# Altium footprint library ICL_connectors_v1.PcbLib: 86 footprints (part 1 of 6)
Each footprint in its own frame and in the unit in brackets; x right, y up, seen from the top. Pads: shape width x height; smd on the part's side, far side on the other; paste and mask are expansions set on the pad; w line width, h text height; cw(c..) or ccw(c..) is an arc to the next point about the centre after c.
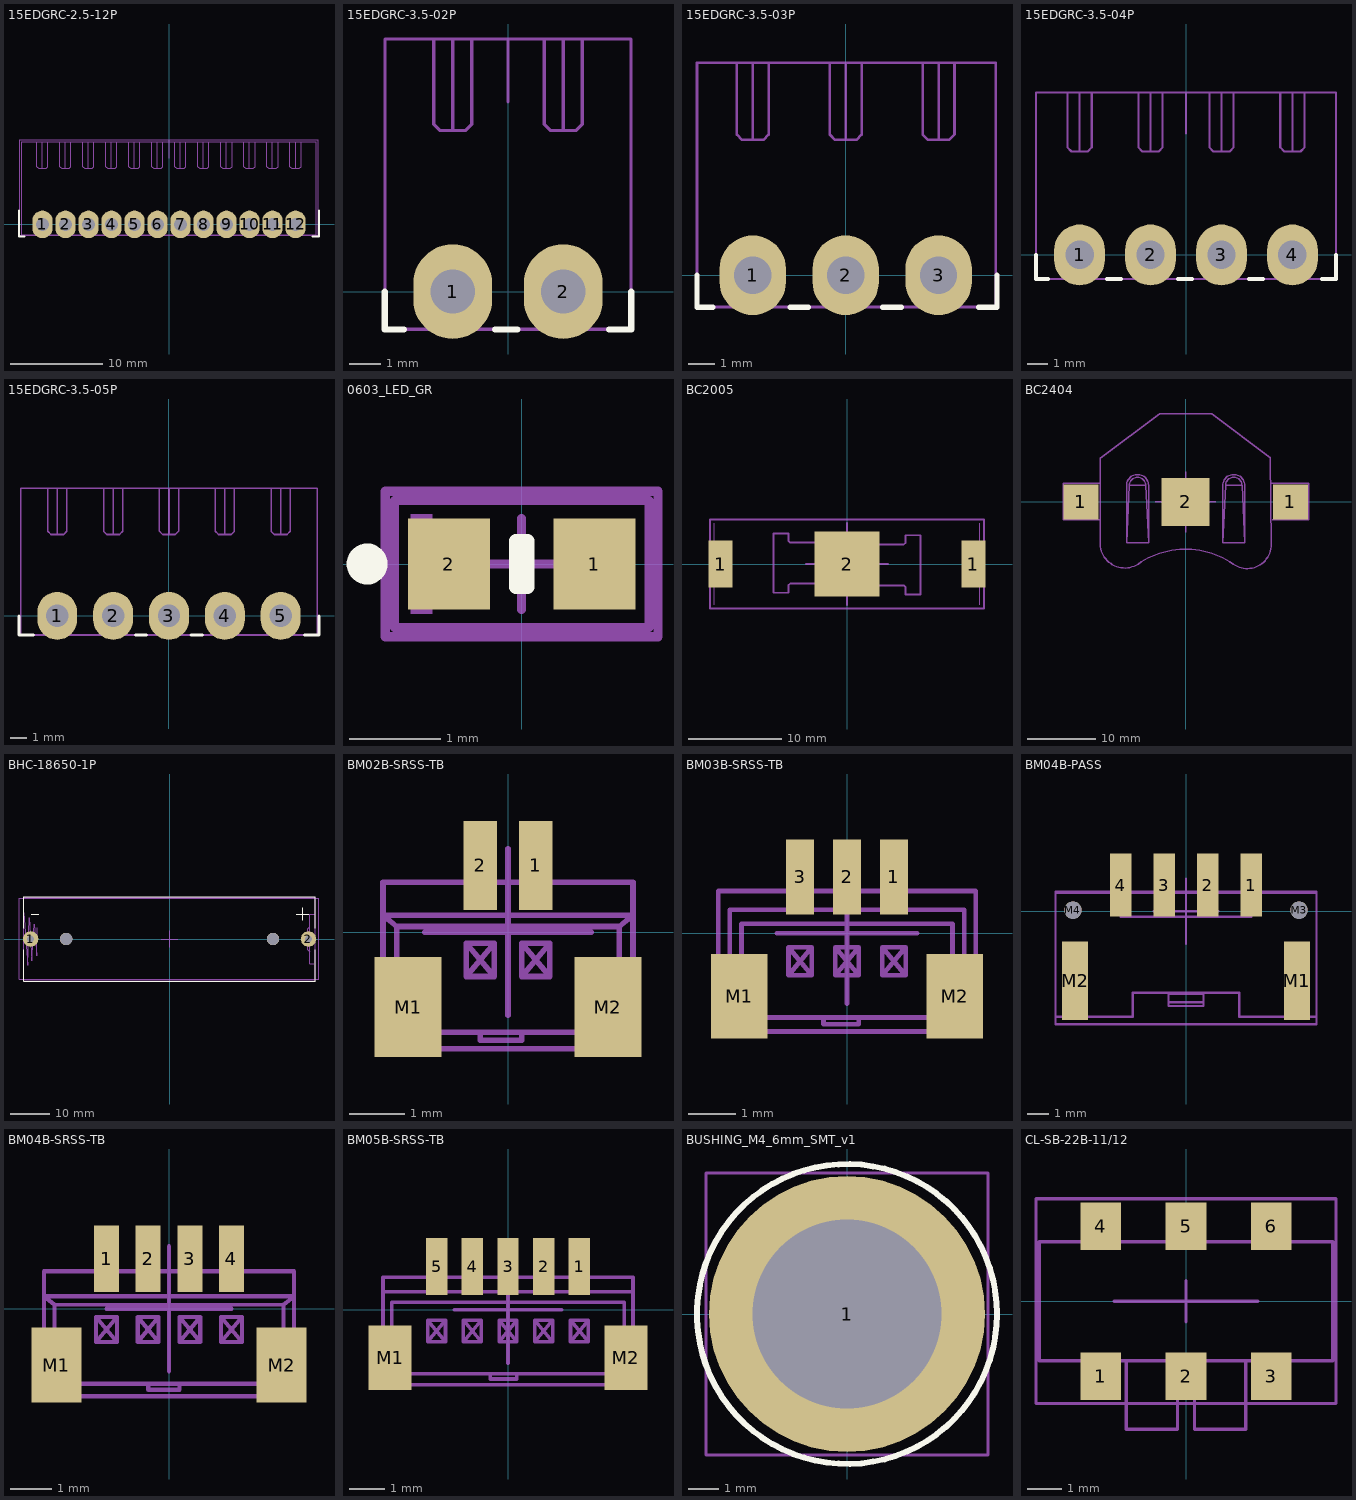
[diagram p0: the footprints below, top view; thin cyan lines are the x and y axes]

## 15EDGRC-2.5-12P [mm] "Dexon"
pads (12):
  oval 2.2x3 hole 1.4 paste-1: 1(-13.75,0) 2(-11.25,0) 3(-8.75,0) 4(-6.25,0) 5(-3.75,0) 6(-1.25,0) 7(1.25,0) 8(3.75,0) 9(6.25,0) 10(8.75,0) 11(11.25,0) 12(13.75,0)
Top Overlay:
  lines w0.2: -16.3,1.5 -16.3,-1.3 -15.7,-1.3 ; 15.6,-1.3 16.3,-1.3 16.3,1.5
Top M17-18_TDES:
  text "'.Designator'" at -6.798,2.1 h1.2
Top M19-20_TMOT:
  lines w0.1: -14.353,8.988 -14.353,6.288 -14.153,6.088 -13.754,6.088 ; -13.754,8.988 -13.754,6.088 ; -13.153,8.988 -13.153,6.288 -13.354,6.088 -13.754,6.088 ; -11.853,8.988 -11.853,6.288 -11.653,6.088 -11.254,6.088 ; -11.254,8.988 -11.254,6.088 ; -10.653,8.988 -10.653,6.288 -10.854,6.088 -11.254,6.088 ; -9.353,8.988 -9.353,6.288 -9.153,6.088 -8.754,6.088 ; -8.754,8.988 -8.754,6.088 ; -8.153,8.988 -8.153,6.288 -8.354,6.088 -8.754,6.088 ; -7.4,-1.191 7.398,-1.191 ; -6.853,8.988 -6.853,6.288 -6.653,6.088 -6.254,6.088 ; -6.254,8.988 -6.254,6.088 ; -5.653,8.988 -5.653,6.288 -5.854,6.088 -6.254,6.088 ; -4.353,8.988 -4.353,6.288 -4.153,6.088 -3.754,6.088 ; -3.754,8.988 -3.754,6.088 ; -3.153,8.988 -3.153,6.288 -3.354,6.088 -3.754,6.088 ; 0.647,8.988 0.647,6.288 0.847,6.088 1.246,6.088 ; 1.246,8.988 1.246,6.088 ; 1.847,8.988 1.847,6.288 1.646,6.088 1.246,6.088 ; 3.147,8.988 3.147,6.288 3.347,6.088 3.746,6.088 ; 3.746,8.988 3.746,6.088 ; 4.347,8.988 4.347,6.288 4.146,6.088 3.746,6.088 ; 5.647,8.988 5.647,6.288 5.847,6.088 6.247,6.088 ; 6.247,8.988 6.247,6.088 ; 6.847,8.988 6.847,6.288 6.646,6.088 6.247,6.088 ; 8.147,8.988 8.147,6.288 8.347,6.088 8.747,6.088 ; 8.747,8.988 8.747,6.088 ; 9.347,8.988 9.347,6.288 9.146,6.088 8.747,6.088 ; 10.647,8.988 10.647,6.288 10.847,6.088 11.247,6.088 ; 11.247,8.988 11.247,6.088 ; 11.847,8.988 11.847,6.288 11.646,6.088 11.247,6.088 ; 13.147,8.988 13.147,6.288 13.347,6.088 13.747,6.088 ; 13.747,8.988 13.747,6.088 ; 14.347,8.988 14.347,6.288 14.146,6.088 13.747,6.088 ; -1.853,6.288 -1.653,6.088 ; -1.853,6.288 -1.853,8.988 -1.853,6.288 ; -1.853,6.288 -1.653,6.088 ; -1.653,6.088 -1.254,6.088 ; -1.653,6.088 -1.254,6.088 ; -1.254,6.088 -0.854,6.088 ; -1.254,6.088 -1.254,8.988 -1.254,6.088 ; -1.254,6.088 -0.854,6.088 ; -0.854,6.088 -0.653,6.288 ; -0.854,6.088 -0.653,6.288 ; -0.653,6.288 -0.653,8.988 -0.653,6.288 ; -16,-1.1 16,-1.1 16,9 -16,9 -16,-1.1
Top M25-26_TORG:
  lines w0.1: 0,7.2 0,9.2 ; -16.2,-1.2 16.2,-1.2 16.2,9.2 -16.2,9.2 -16.2,-1.2
3D body "STP_691382010012 (rev1).stp": height 8.11, standoff -3.49, extent -16,-1.1 16,9

## 15EDGRC-3.5-02P [mm] "Dexon"
pads (2):
  oval 2.5x3 hole 1.4 paste-1: 1(-1.75,0) 2(1.75,0)
Top Overlay:
  lines w0.2: -3.9,0 -3.9,-1.2 -3.3,-1.2 ; -0.4,-1.2 0.3,-1.2 ; 3.2,-1.2 3.9,-1.2 3.9,0
Top M15-16_SORG:
  lines w0.1: 0,6 0,8 ; -3.9,-1.2 -3.9,8 3.9,8 3.9,-1.2 -3.9,-1.2
Top M17-18_TDES:
  text "'.Designator'" at -5.765,2.883 h1
Top M19-20_TMOT:
  lines w0.1: -2.35,8 -2.35,5.3 -2.15,5.1 -1.75,5.1 ; -1.75,8 -1.75,5.1 ; -1.15,8 -1.15,5.3 -1.35,5.1 -1.75,5.1 ; 1.15,8 1.15,5.3 1.35,5.1 1.75,5.1 ; 1.75,8 1.75,5.1 ; 2.35,8 2.35,5.3 2.15,5.1 1.75,5.1 ; -3.9,-1.191 -3.9,8 3.898,8 3.898,-1.191 -3.9,-1.191
3D body "15EDGRC-3_5-2.STEP": height 7.21, standoff -3.39, extent -3.9,-1.2 3.9,8

## 15EDGRC-3.5-03P [mm] "Dexon"
pads (3):
  oval 2.5x3 hole 1.4 paste-1: 1(-3.5,0) 2(0,0) 3(3.5,0)
Top Overlay:
  lines w0.2: -5.6,0 -5.6,-1.2 -5,-1.2 ; -2.1,-1.2 -1.4,-1.2 ; 1.4,-1.2 2.1,-1.2 ; 5,-1.2 5.7,-1.2 5.7,0
Top M15-16_SORG:
  lines w0.1: 0,6 0,8 ; -5.6,-1.2 5.65,-1.2 5.65,8 -5.6,8 -5.6,-1.2
Top M17-18_TDES:
  text "'.Designator'" at -5.665,2.483 h1
Top M19-20_TMOT:
  lines w0.1: -4.1,8 -4.1,5.3 -3.9,5.1 -3.5,5.1 ; -3.5,8 -3.5,5.1 ; -2.9,8 -2.9,5.3 -3.1,5.1 -3.5,5.1 ; -0.6,8 -0.6,5.3 -0.4,5.1 0,5.1 ; 0,8 0,5.1 ; 0.6,8 0.6,5.3 0.4,5.1 0,5.1 ; 2.9,8 2.9,5.3 3.1,5.1 3.5,5.1 ; 3.5,8 3.5,5.1 ; 4.1,8 4.1,5.3 3.9,5.1 3.5,5.1 ; -5.6,-1.191 5.648,-1.191 5.648,8 -5.6,8 -5.6,-1.191
3D body "15EDGRC-3_5-03P.STEP": height 7.21, standoff -3.39, extent -5.6,-1.2 5.65,8

## 15EDGRC-3.5-04P [mm] "Dexon"
pads (4):
  oval 2.5x3 hole 1.4 paste-1: 1(-5.25,0) 2(-1.75,0) 3(1.75,0) 4(5.25,0)
Top Overlay:
  lines w0.2: -7.4,0 -7.4,-1.2 -6.8,-1.2 ; -3.9,-1.2 -3.2,-1.2 ; -0.4,-1.2 0.3,-1.2 ; 3.1,-1.2 3.8,-1.2 ; 6.7,-1.2 7.4,-1.2 7.4,0
Top M17-18_TDES:
  text "'.Designator'" at -6.798,2.1 h1.2
Top M19-20_TMOT:
  lines w0.1: -5.85,8 -5.85,5.3 -5.65,5.1 -5.25,5.1 ; -5.25,8 -5.25,5.1 ; -4.65,8 -4.65,5.3 -4.85,5.1 -5.25,5.1 ; -2.35,8 -2.35,5.3 -2.15,5.1 -1.75,5.1 ; -1.75,8 -1.75,5.1 ; -1.15,8 -1.15,5.3 -1.35,5.1 -1.75,5.1 ; 1.15,8 1.15,5.3 1.35,5.1 1.75,5.1 ; 1.75,8 1.75,5.1 ; 2.35,8 2.35,5.3 2.15,5.1 1.75,5.1 ; 4.65,8 4.65,5.3 4.85,5.1 5.25,5.1 ; 5.25,8 5.25,5.1 ; 5.85,8 5.85,5.3 5.65,5.1 5.25,5.1 ; -7.4,-1.191 7.398,-1.191 7.398,8 -7.4,8 -7.4,-1.191
Top M25-26_TORG:
  lines w0.1: 0,6 0,8 ; -7.4,-1.2 7.4,-1.2 7.4,8 -7.4,8 -7.4,-1.2
3D body "15EDGRC-3_5-04P.STEP": height 7.21, standoff -3.39, extent -7.4,-1.2 7.4,8

## 15EDGRC-3.5-05P [mm] "Dexon"
pads (5):
  oval 2.5x3 hole 1.4 paste-1: 1(-7,0) 2(-3.5,0) 3(0,0) 4(3.5,0) 5(7,0)
Top Overlay:
  lines w0.2: -9.4,0 -9.4,-1.2 -8.5,-1.2 ; -2.1,-1.2 -1.4,-1.2 ; 1.4,-1.2 2.1,-1.2 ; 8.5,-1.2 9.402,-1.2 9.402,0
Top M15-16_SORG:
  lines w0.1: 0,6 0,8 ; -9.3,-1.2 9.3,-1.2 9.3,8 -9.3,8 -9.3,-1.2
Top M17-18_TDES:
  text "'.Designator'" at -6.798,2.5 h1.2
Top M19-20_TMOT:
  lines w0.1: -7.6,8 -7.6,5.3 -7.4,5.1 -7,5.1 ; -7,8 -7,5.1 ; -6.4,8 -6.4,5.3 -6.6,5.1 -7,5.1 ; -4.1,8 -4.1,5.3 -3.9,5.1 -3.5,5.1 ; -3.5,8 -3.5,5.1 ; -2.9,8 -2.9,5.3 -3.1,5.1 -3.5,5.1 ; -0.6,8 -0.6,5.3 -0.4,5.1 0,5.1 ; 0,8 0,5.1 ; 0.6,8 0.6,5.3 0.4,5.1 0,5.1 ; 2.9,8 2.9,5.3 3.1,5.1 3.5,5.1 ; 3.5,8 3.5,5.1 ; 4.1,8 4.1,5.3 3.9,5.1 3.5,5.1 ; 6.4,8 6.4,5.3 6.6,5.1 7,5.1 ; 7,8 7,5.1 ; 7.6,8 7.6,5.3 7.4,5.1 7,5.1 ; -9.3,-1.191 -9.3,8 9.3,8 9.3,-1.191 -9.3,-1.191
3D body "691322110005_15EDGRC-3_5-05P.stp": height 7.22, standoff -3.48, extent -9.3,-1.2 9.3,8

## 0603_LED_GR [mm] "0603 LED Green"
height 0.381
pads (2):
  rect 0.9x1 smd: 1(0.8,0) 2(-0.8,0)
Top Overlay:
  circle w0.25: c-1.7,0 r0.1
  lines w0.152: -0.064,-0.254 0.064,-0.254 0.064,0.254 -0.064,0.254 -0.064,-0.254
Top M11-12_SMOT:
  rectangle: -1.22,-0.55 -0.983,0.549
  lines w0.1: -1.4,-0.7 1.4,-0.7 1.4,0.7 -1.4,0.7 -1.4,-0.7
Top M13-14_SDES:
  text "'.Designator'" at -2.832,-0.208 h0.5
Top M15-16_SORG:
  lines w0.1: -0.5,0 0.5,0 ; 0,-0.5 0,0.5 ; -1.5,-0.8 1.5,-0.8 1.5,0.8 -1.5,0.8 -1.5,-0.8
3D body "LED_0603_G.STEP": height 0.61, standoff 0.01, extent -0.8,-0.4 0.8,0.4

## BC2005 [mm] "CR2450"
pads (3):
  rect 2.6x5.08 smd: 1(-13.6,0) 1(13.6,0)
  rect 7x7 smd paste-2.6: 2(0,0)
Top M11-12_SMOT:
  lines w0.1: -14.3,-4.4 -14.3,4.4 ; 14.3,-4.4 14.3,4.4
  lines w0.2: -3,-2.1 -6.1,-2.1 -6.3,-2.3 -6.3,-3.1 -7.9,-3.1 -7.9,3.3 -6.3,3.3 -6.3,2.5 -6.1,2.3 -3,2.3 ; 3,-2.3 6.1,-2.3 6.3,-2.5 6.3,-3.3 7.9,-3.3 7.9,3.1 6.3,3.1 6.3,2.3 6.1,2.1 3,2.1 ; -14.73,-4.78 14.73,-4.78 14.73,4.78 -14.73,4.78 -14.73,-4.78
Top M13-14_SDES:
  text "'.Designator'" at -10.597,-7.95 h1.8
Top M15-16_SORG:
  lines w0.2: -4.4,0 0,0 ; 0,-4.4 0,0 ; 0,4.4 0,0 ; 4.4,0 0,0
3D body "BC-2005.STEP": height 5.86, standoff 0.01, extent -14.73,-4.78 14.73,4.78

## BC2404 [mm] "CR2450"
pads (3):
  rect 5.1x5.1 smd: 1(-15.25,0) 1(15.25,0)
  rect 7x7 smd paste-2.6: 2(0,0)
Top M11-12_SMOT:
  lines w0.2: -12.5,-2.6 -17.8,-2.6 -17.8,2.7 -12.5,2.7 ; -12.45,-6.2 ccw(c-8.849,-6.005) -6.929,-9.058 cw(c0,-18.855) 6.929,-9.058 ccw(c8.95,-6.2) 12.45,-6.2 12.324,6.349 12.309,6.452 3.8,12.8 -3.8,12.8 -12.446,6.35 -12.446,-6.2 ; 12.5,2.7 17.9,2.7 17.9,-2.6 12.6,-2.6 ; -8.6,-5.95 -8.6,2.398 cw(c-7,2.4) -5.4,2.398 -5.4,-5.95 ; -8.6,-5.95 -5.4,-5.95 ; -8.6,-5.95 -8.2,2.398 ; -8.2,2.398 cw(c-7,2.4) -5.8,2.398 ; -8.2,2.398 -5.8,2.398 ; -5.8,2.398 -5.4,-5.95 ; 5.4,-5.95 5.4,2.398 cw(c7,2.4) 8.6,2.398 8.6,-5.95 ; 5.4,-5.95 8.6,-5.95 ; 5.4,-5.95 5.8,2.398 ; 5.8,2.398 cw(c7,2.4) 8.2,2.398 ; 5.8,2.398 8.2,2.398 ; 8.2,2.398 8.6,-5.95
Top M13-14_SDES:
  text "'.Designator'" at -10.597,-7.95 h1.8
Top M15-16_SORG:
  lines w0.2: -4.4,0 0,0 ; 0,-4.4 0,0 ; 0,4.4 0,0 ; 4.4,0 0,0
3D body "CR2450.step": height 5.81, standoff 0.01, extent -17.8,-9.697 17.8,12.9

## BHC-18650-1P [mm] "COMF baterry holder 18650 THT 1p"
pads (4):
  round 4 hole 1.8: 1(-35.7,0) 2(35.7,0)
  round 3.2 hole 3.2 unplated: MH1(-26.58,0) MH2(26.58,0)
Top Overlay:
  lines w0.2: -37.5,-2.7 -37.5,-10.8 37.5,-10.8 37.5,-2.7 ; -37.5,2.7 -37.5,10.8 37.5,10.8 37.5,2.7
  lines w0.3: -35.5,6.4 -33.6,6.4 ; 32.6,6.4 34.2,6.4 ; 34.2,4.8 34.2,6.4 ; 34.2,8 34.2,6.4 ; 35.8,6.4 34.2,6.4
Top M15-16_SORG:
  lines w0.1: -2.1,0 0,0 ; 0,-2.1 0,0 ; 0,2.1 0,0 ; 2.1,0 0,0
  lines w0.2: -37.5,-10.75 -37.5,10.75 37.5,10.75 37.5,-10.75 -37.5,-10.75
Top M17-18_TDES:
  text "'.Designator'" at -16.994,-1.25 h3
Top M19-20_TMOT:
  lines w0.2: -37.5,-10.4 -37.5,10.5 ; -37.5,6.8 -36.4,-6.8 -36.1,5.5 -35.4,-5.6 -34.8,3.8 -34.2,-4.3 -34,2.9 ; 36,-3.3 35.5,-2.8 35.5,2.6 36,3.1 ; 37.5,-10.5 37.5,10.4 ; 37.5,-6.3 36,-6.3 36,6.3 37.5,6.3 ; -38.7,-10.4 38.4,-10.4 38.4,10.5 -38.7,10.5 -38.7,-10.4
3D body "User Library-18650 Full.STEP": height 21.66, standoff -3.81, extent -38.825,-10.5 38.825,10.3

## BM02B-SRSS-TB [mm] "JST SH connector 1mm"
height 1.45
pads (4):
  rect 0.6x1.6 smd: 1(0.5,1.2) 2(-0.5,1.2)
  rect 1.2x1.8 smd: M1(-1.8,-1.35) M2(1.8,-1.35)
Top M11-12_SMOT:
  lines w0.1: -0.5,-1.8 -0.5,-1.945 0.25,-1.945 0.25,-1.812 ; -2.25,-2.1 2.25,-2.1 ; -2.25,-2.1 -2.25,0.3 ; -2.25,-2.1 -2,-1.8 ; -2.25,0.3 2.25,0.3 ; -2.25,0.3 -2,0.1 ; -2,-1.8 -2,0.1 ; -2,-1.8 2,-1.8 ; -2,0.1 2,0.1 ; -0.75,-0.8 -0.25,-0.8 ; -0.75,-0.8 -0.75,-0.2 ; -0.75,-0.8 -0.25,-0.2 ; -0.75,-0.2 -0.25,-0.2 ; -0.75,-0.2 -0.25,-0.8 ; -0.25,-0.8 -0.25,-0.6 -0.25,-0.2 ; 0.25,-0.8 0.75,-0.8 ; 0.25,-0.8 0.25,-0.2 ; 0.25,-0.8 0.75,-0.2 ; 0.25,-0.2 0.75,-0.2 ; 0.25,-0.2 0.75,-0.8 ; 0.75,-0.8 0.75,-0.6 0.75,-0.2 ; 2,-1.8 2,0.1 ; 2,-1.8 2.25,-2.1 ; 2,0.1 2.25,0.3 ; 2.25,-2.1 2.25,0.3
Top M13-14_SDES:
  text "'.Designator'" at -5.665,-3.617 h1
Top M15-16_SORG:
  lines w0.1: -1.5,0 0,0 ; 0,-1.5 0,0 ; 0,1.5 0,0 ; 1.5,0 0,0 ; -2.25,-2.1 2.25,-2.1 2.25,0.9 -2.25,0.9 -2.25,-2.1
3D body "BM02B-SRSS-TB.STEP": height 4.33, standoff 0.01, extent -1.988,-2.104 2.012,1.496

## BM03B-SRSS-TB [mm] "JST SH connector 1mm"
height 1.45
pads (5):
  rect 0.6x1.6 smd: 1(1,1.2) 2(0,1.2) 3(-1,1.2)
  rect 1.2x1.8 smd: M1(-2.3,-1.35) M2(2.3,-1.35)
Top M11-12_SMOT:
  lines w0.1: -0.5,-1.8 -0.5,-1.945 0.25,-1.945 0.25,-1.812 ; -1.25,-0.9 -0.75,-0.3 ; -1.25,-0.9 -1.25,-0.3 ; -1.25,-0.9 -0.75,-0.9 ; -1.25,-0.3 -0.75,-0.9 ; -1.25,-0.3 -0.75,-0.3 ; -0.75,-0.9 -0.75,-0.7 -0.75,-0.3 ; -0.25,-0.9 0.25,-0.3 ; -0.25,-0.9 -0.25,-0.3 ; -0.25,-0.9 0.25,-0.9 ; -0.25,-0.3 0.25,-0.9 ; -0.25,-0.3 0.25,-0.3 ; 0.25,-0.9 0.25,-0.7 0.25,-0.3 ; 0.75,-0.9 1.25,-0.3 ; 0.75,-0.9 0.75,-0.3 ; 0.75,-0.9 1.25,-0.9 ; 0.75,-0.3 1.25,-0.9 ; 0.75,-0.3 1.25,-0.3 ; 1.25,-0.9 1.25,-0.7 1.25,-0.3 ; -2.5,-2.1 -2.5,0.5 2.5,0.5 2.5,-2.1 -2.5,-2.1 ; -2.25,-1.8 2.25,-1.8 2.25,0.2 -2.25,0.2 -2.25,-1.8
Top M13-14_SDES:
  text "'.Designator'" at -5.665,-3.617 h1
Top M15-16_SORG:
  lines w0.1: -1.5,0 0,0 ; 0,-1.5 0,0 ; 0,1.5 0,0 ; 1.5,0 0,0 ; -2.75,-2.1 -2.75,0.9 2.75,0.9 2.75,-2.1 -2.75,-2.1
3D body "BM03B-SRSS-TB.STEP": height 4.33, standoff 0.01, extent -2.488,-2.104 2.512,1.496

## BM04B-PASS [mm] "JST PA connector 2mm"
height 1.45
pads (8):
  rect 1x2.9 smd: 1(3,1.2) 2(1,1.2) 3(-1,1.2) 4(-3,1.2)
  rect 1.2x3.6 smd: M1(5.1,-3.2) M2(-5.1,-3.2)
  round 0.8 hole 0.8 unplated: M3(5.2,0.05) M4(-5.2,0.05)
Top M11-12_SMOT:
  rectangle: 2.6,0.85 3.4,2.5
  rectangle: 0.6,0.85 1.4,2.5
  rectangle: -1.4,0.85 -0.6,2.5
  rectangle: -3.4,0.85 -2.6,2.5
  lines w0.1: -0.807,-4.186 0.796,-4.186 ; 3,0.85 3,-0.25 ; -3,-0.25 3,-0.25 ; -3,-0.25 -3,0.85 -3,-0.25 ; -3,-0.25 3,-0.25 ; -6,-4.85 -6,0.85 6,0.85 6,-4.85 2.45,-4.85 2.45,-3.75 -2.45,-3.75 -2.45,-4.85 -6,-4.85 ; -0.8,-4.35 0.8,-4.35 0.8,-3.8 -0.8,-3.8 -0.8,-4.35
Top M13-14_SDES:
  text "'.Designator'" at -5.665,-3.617 h1
Top M15-16_SORG:
  lines w0.1: -1.5,0 0,0 ; 0,-1.5 0,0 ; 0,1.5 0,0 ; 1.5,0 0,0 ; -6,-5.2 6,-5.2 6,0.9 -6,0.9 -6,-5.2
3D body "BM04B-PASS-1-TF.STEP": height 9.01, standoff -0.39, extent -6,-4.85 6,2.25

## BM04B-SRSS-TB [mm] "JST SH connector 1mm"
height 1.45
pads (6):
  rect 0.6x1.6 smd: 1(-1.5,1.2) 2(-0.5,1.2) 3(0.5,1.2) 4(1.5,1.2)
  rect 1.2x1.8 smd: M1(-2.7,-1.35) M2(2.7,-1.35)
Top M11-12_SMOT:
  lines w0.1: -3,0.3 3,0.3 ; -2.75,-1.8 2.75,-1.8 ; -2.75,0.101 2.75,0.095 ; -0.5,-1.8 -0.5,-1.945 0.25,-1.945 0.25,-1.812 ; 3,-2.102 -3,-2.087 ; -3,-2.087 -2.75,-1.787 -2.75,0.097 -3,0.297 -3,-2.087 ; -1.75,-0.8 -1.25,-0.2 ; -1.75,-0.8 -1.75,-0.2 ; -1.75,-0.8 -1.25,-0.8 ; -1.75,-0.2 -1.25,-0.8 ; -1.75,-0.2 -1.25,-0.2 ; -1.25,-0.8 -1.25,-0.2 ; -0.75,-0.8 -0.25,-0.2 ; -0.75,-0.8 -0.75,-0.2 ; -0.75,-0.8 -0.25,-0.8 ; -0.75,-0.2 -0.25,-0.8 ; -0.75,-0.2 -0.25,-0.2 ; -0.25,-0.8 -0.25,-0.6 -0.25,-0.2 ; 0.25,-0.8 0.75,-0.2 ; 0.25,-0.8 0.25,-0.2 ; 0.25,-0.8 0.75,-0.8 ; 0.25,-0.2 0.75,-0.8 ; 0.25,-0.2 0.75,-0.2 ; 0.75,-0.8 0.75,-0.2 ; 1.25,-0.8 1.75,-0.2 ; 1.25,-0.8 1.25,-0.2 ; 1.25,-0.8 1.75,-0.8 ; 1.25,-0.2 1.75,-0.8 ; 1.25,-0.2 1.75,-0.2 ; 1.75,-0.8 1.75,-0.2 ; 2.75,0.095 3,0.295 3,-2.087 2.75,-1.787 2.75,0.095
Top M13-14_SDES:
  text "'.Designator'" at -5.665,-3.617 h1
Top M15-16_SORG:
  lines w0.1: -1.5,0 0,0 ; 0,-1.5 0,0 ; 0,1.5 0,0 ; 1.5,0 0,0 ; -3,-2.1 -3,0.9 3,0.9 3,-2.1 -3,-2.1
3D body "BM04B-SRSS-TB.STEP": height 4.33, standoff 0.01, extent -3.004,-2.105 2.996,1.495

## BM05B-SRSS-TB [mm] "JST SH connector 1mm"
height 1.45
pads (7):
  rect 0.6x1.6 smd: 1(2,1.2) 2(1,1.2) 3(0,1.2) 4(-1,1.2) 5(-2,1.2)
  rect 1.2x1.8 smd: M1(-3.3,-1.35) M2(3.3,-1.35)
Top M11-12_SMOT:
  lines w0.1: -0.5,-1.8 -0.5,-1.945 0.25,-1.945 0.25,-1.812 ; -2.25,-0.9 -1.75,-0.3 ; -2.25,-0.9 -2.25,-0.3 ; -2.25,-0.9 -1.75,-0.9 ; -2.25,-0.3 -1.75,-0.9 ; -2.25,-0.3 -1.75,-0.3 ; -1.75,-0.9 -1.75,-0.3 ; -1.25,-0.9 -0.75,-0.3 ; -1.25,-0.9 -1.25,-0.3 ; -1.25,-0.9 -0.75,-0.9 ; -1.25,-0.3 -0.75,-0.9 ; -1.25,-0.3 -0.75,-0.3 ; -0.75,-0.9 -0.75,-0.7 -0.75,-0.3 ; -0.25,-0.9 0.25,-0.3 ; -0.25,-0.9 -0.25,-0.3 ; -0.25,-0.9 0.25,-0.9 ; -0.25,-0.3 0.25,-0.9 ; -0.25,-0.3 0.25,-0.3 ; 0.25,-0.9 0.25,-0.3 ; 0.75,-0.9 1.25,-0.3 ; 0.75,-0.9 0.75,-0.3 ; 0.75,-0.9 1.25,-0.9 ; 0.75,-0.3 1.25,-0.9 ; 0.75,-0.3 1.25,-0.3 ; 1.25,-0.9 1.25,-0.7 1.25,-0.3 ; 1.75,-0.9 2.25,-0.3 ; 1.75,-0.9 1.75,-0.3 ; 1.75,-0.9 2.25,-0.9 ; 1.75,-0.3 2.25,-0.9 ; 1.75,-0.3 2.25,-0.3 ; 2.25,-0.9 2.25,-0.3 ; -3.5,-2.1 -3.5,0.5 3.5,0.5 3.5,-2.1 -3.5,-2.1 ; -3.25,-1.8 3.25,-1.8 3.25,0.2 -3.25,0.2 -3.25,-1.8
Top M13-14_SDES:
  text "'.Designator'" at -5.665,-3.617 h1
Top M15-16_SORG:
  lines w0.1: -1.5,0 0,0 ; 0,-1.5 0,0 ; 0,1.5 0,0 ; 1.5,0 0,0 ; -3.5,-2.1 -3.5,0.9 3.5,0.9 3.5,-2.1 -3.5,-2.1
3D body "BM05B-SRSS-TB.STEP": height 4.33, standoff 0.01, extent -3.488,-2.104 3.512,1.496

## BUSHING_M4_6mm_SMT_v1 [mm] "bushing M4 6mm"
pads (1):
  round 9.2 hole 6.3: 1(0,0)
Top Overlay:
  circle w0.2: c0,0 r5
Top M15-16_SORG:
  lines w0.1: -2,0 0,0 ; 0,-2 0,0 ; 0,2 0,0 ; 2,0 0,0 ; -4.7,-4.7 4.7,-4.7 4.7,4.7 -4.7,4.7 -4.7,-4.7
Top M17-18_TDES:
  text "'.Designator'" at -5.665,-6.617 h1
Top M19-20_TMOT:
  circle w0.3: c0,0 r4.4
  circle w0.3: c0,0 r3
  lines w0.1: -4.4,0 0,4.4 ; -4.3,-0.8 -2.95,0.55 ; -4.25,1.05 -1,4.3 ; -4.15,-1.55 -3,-0.4 ; -3.85,-2.15 -2.85,-1.15 ; -3.45,-2.65 -2.5,-1.7 ; -3.05,-3.15 -2.1,-2.2 ; -2.6,-3.6 -1.65,-2.65 ; -2.05,-3.95 -0.95,-2.85 ; -1.35,-4.15 -0.2,-3 ; -0.7,-4.4 0.8,-2.9 ; -0.5,3 0.8,4.3 ; 0.279,-4.376 4.365,-0.166 ; 0.4,3 1.5,4.1 ; 1.1,2.8 2.2,3.9 ; 1.415,-4.115 4.272,-1.172 ; 1.7,2.5 2.75,3.55 ; 2.2,2.1 3.15,3.05 ; 2.6,1.6 3.6,2.6 ; 2.85,0.95 3.9,2 ; 3.05,-0.65 4.4,0.7 ; 3.05,0.25 4.15,1.35
3D body "nuts_M4_6mm.stp": height 6.01, standoff -1.52, extent -4.367,-4.37 4.367,4.37

## CL-SB-22B-11/12 [mm] "switch side"
pads (6):
  rect 1.2x1.4 smd: 1(-2.5,-2.2) 2(0,-2.2) 3(2.5,-2.2) 4(-2.5,2.2) 5(0,2.2) 6(2.5,2.2)
Top M11-12_SMOT:
  region: -2.1,-1.763 -2.9,-1.763 -2.9,-2.6 -2.1,-2.6
  region: 0.4,-1.748 -0.4,-1.748 -0.4,-2.6 0.4,-2.6
  region: 2.9,-1.76 2.1,-1.76 2.1,-2.6 2.9,-2.6
  rectangle: 2.1,1.759 2.9,2.6
  rectangle: -0.4,1.75 0.4,2.6
  rectangle: -2.9,1.758 -2.1,2.6
  lines w0.1: -1.75,-1.8 -1.75,-3.75 -0.25,-3.75 -0.25,-1.8 ; 0.25,-1.8 0.25,-3.75 1.75,-3.75 1.75,-1.8 ; -4.3,-1.75 -4.3,1.75 4.3,1.75 4.3,-1.75 -4.3,-1.75
Top M13-14_SDES:
  text "'.Designator'" at -5.665,-0.417 h1
Top M15-16_SORG:
  lines w0.1: -2.1,0 2.1,0 ; 0,-0.6 0,0.6 ; -4.4,-3 4.4,-3 4.4,3 -4.4,3 -4.4,-3
3D body "CL-SB-22B-11.stp": height 3.51, standoff 0.01, extent -4.25,-3.75 4.25,2.5